# Altium footprint library rus.PcbLib: 83 footprints (part 2 of 6)
Each footprint in its own frame and in the unit in brackets; x right, y up, seen from the top. Pads: shape width x height; smd on the part's side, far side on the other; paste and mask are expansions set on the pad; w line width, h text height; cw(c..) or ccw(c..) is an arc to the next point about the centre after c.
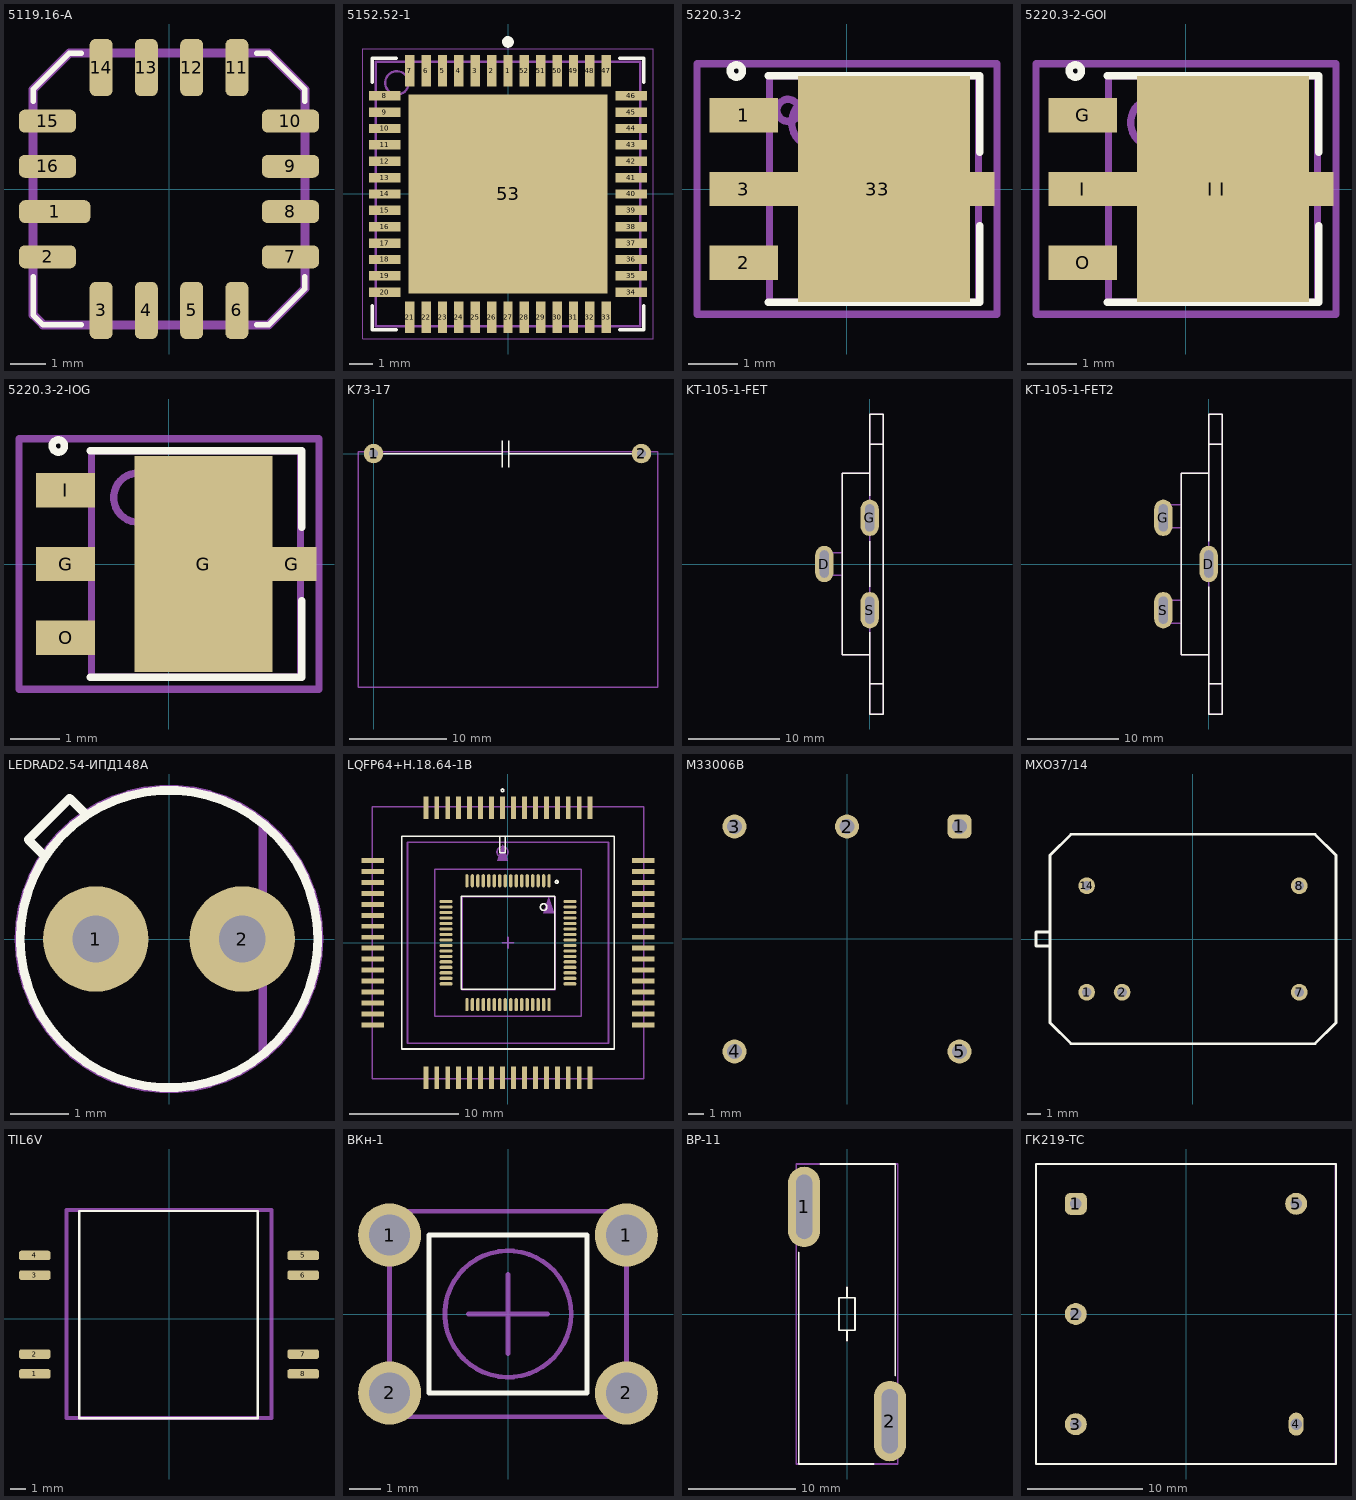
[diagram p1: the footprints below, top view; thin cyan lines are the x and y axes]

## 5119.16-А [mm] "5119.16-А"
height 0.7
pads (16):
  rrect50% 2x0.64 smd: 1(-3.205,-0.635)
  rrect50% 1.6x0.64 smd: 2(-3.408,-1.905) 7(3.408,-1.905) 8(3.408,-0.635) 9(3.408,0.635) 10(3.408,1.905) 15(-3.408,1.905) 16(-3.408,0.635)
  rrect50% 0.64x1.6 smd: 3(-1.905,-3.408) 4(-0.635,-3.408) 5(0.635,-3.408) 6(1.905,-3.408) 11(1.905,3.408) 12(0.635,3.408) 13(-0.635,3.408) 14(-1.905,3.408)
Top Overlay:
  lines w0.15: -3.81,-2.464 -3.81,-3.531 -3.531,-3.81 -2.464,-3.81 ; -3.81,2.464 -3.81,2.794 -2.794,3.81 -2.464,3.81 ; 2.464,-3.81 2.794,-3.81 3.81,-2.794 3.81,-2.464 ; 2.464,3.81 2.794,3.81 3.81,2.794 3.81,2.464
  text "." at -4.8,-0.7 h0.1
Top Courtyard:
  lines w0.25: -3.81,-3.531 -3.81,2.794 -2.794,3.81 2.794,3.81 3.81,2.794 3.81,-2.794 2.794,-3.81 -3.531,-3.81 -3.81,-3.531
3D body: height 1.5, standoff 0.15, extent -3.806,-3.806 3.806,3.806
3D body: height 2.4, standoff 0.2, extent -3.429,-3.429 3.429,3.429
3D body: height 1, standoff 0.1, extent -3.831,0.254 -2.667,1.016
3D body: height 1, standoff 0.1, extent -3.831,-1.016 -2.032,-0.254
3D body: height 1, standoff 0.1, extent -3.831,-2.286 -2.667,-1.524
3D body: height 1, standoff 0.1, extent -3.831,1.524 -2.667,2.286
3D body: height 1, standoff 0.1, extent -1.016,-3.831 -0.254,-2.667
3D body: height 1, standoff 0.1, extent 0.254,-3.831 1.016,-2.667
3D body: height 1, standoff 0.1, extent 1.524,-3.831 2.286,-2.667
3D body: height 1, standoff 0.1, extent -2.286,-3.831 -1.524,-2.667
3D body: height 1, standoff 0.1, extent 2.667,-1.016 3.831,-0.254
3D body: height 1, standoff 0.1, extent 2.667,0.254 3.831,1.016
3D body: height 1, standoff 0.1, extent 2.667,1.524 3.831,2.286
3D body: height 1, standoff 0.1, extent 2.667,-2.286 3.831,-1.524
3D body: height 1, standoff 0.1, extent 0.254,2.667 1.016,3.831
3D body: height 1, standoff 0.1, extent -1.016,2.667 -0.254,3.831
3D body: height 1, standoff 0.1, extent -2.286,2.667 -1.524,3.831
3D body: height 1, standoff 0.1, extent 1.524,2.667 2.286,3.831

## 5152.52-1 [mm] "QFN, 52-Leads, Body 11,20x11,20mm, Pitch 0,70mm, Thermal Pad 8,50x8,50mm, IPC Medium Density"
height 2.06
pads (53):
  rect 0.4x1.35 smd: 1(0,5.275) 2(-0.7,5.275) 3(-1.4,5.275) 4(-2.1,5.275) 5(-2.8,5.275) 6(-3.5,5.275) 7(-4.2,5.275) 21(-4.2,-5.275) 22(-3.5,-5.275) 23(-2.8,-5.275) 24(-2.1,-5.275) 25(-1.4,-5.275) 26(-0.7,-5.275) 27(0,-5.275) 28(0.7,-5.275) 29(1.4,-5.275) 30(2.1,-5.275) 31(2.8,-5.275) 32(3.5,-5.275) 33(4.2,-5.275) 47(4.2,5.275) 48(3.5,5.275) 49(2.8,5.275) 50(2.1,5.275) 51(1.4,5.275) 52(0.7,5.275)
  rect 1.35x0.4 smd: 8(-5.275,4.2) 9(-5.275,3.5) 10(-5.275,2.8) 11(-5.275,2.1) 12(-5.275,1.4) 13(-5.275,0.7) 14(-5.275,0) 15(-5.275,-0.7) 16(-5.275,-1.4) 17(-5.275,-2.1) 18(-5.275,-2.8) 19(-5.275,-3.5) 20(-5.275,-4.2) 34(5.275,-4.2) 35(5.275,-3.5) 36(5.275,-2.8) 37(5.275,-2.1) 38(5.275,-1.4) 39(5.275,-0.7) 40(5.275,0) 41(5.275,0.7) 42(5.275,1.4) 43(5.275,2.1) 44(5.275,2.8) 45(5.275,3.5) 46(5.275,4.2)
  rect 8.5x8.5 smd: 53(0,0)
Top Overlay:
  circle w0.25: c0,6.5 r0.125
  lines w0.15: -5.8,-4.775 -5.8,-5.8 -4.775,-5.8 ; -5.8,4.775 -5.8,5.8 -4.775,5.8 ; 4.775,-5.8 5.8,-5.8 5.8,-4.775 ; 4.775,5.8 5.8,5.8 5.8,4.775
Mechanical 13:
  circle w0.1: c-4.75,4.75 r0.5
  lines w0.1: -5.65,-5.65 5.65,-5.65 5.65,5.65 -5.65,5.65 -5.65,-5.65
Mechanical 15:
  lines w0.05: -6.2,-6.2 6.2,-6.2 6.2,6.2 -6.2,6.2 -6.2,-6.2
  lines w0.1: -0.5,0 0.5,0 ; 0,-0.5 0,0.5
3D body "5152.52-1.step": height 2.06, standoff 0, extent -5.651,-5.651 5.651,5.651

## 5220.3-2 [mm] "SOT89, 3-Leads, Body 4,60x4,25mm, Pitch 1,50mm, Lead Span 4,8mm, IPC Medium Density"
height 1.6
pads (5):
  rect 1.4x0.7 smd: 1(-2.1,1.5) 2(-2.1,-1.5) 3(-2.1,0)
  rect 5x0.7 smd: 3(0.5,0)
  rect 3.5x4.6 smd: 3(0.75,0)
Top Overlay:
  circle w0.15: c-2.25,2.4 r0.125
  lines w0.15: -1.6,-2.3 2.7,-2.3 2.7,-0.75 ; -1.6,2.3 2.7,2.3 2.7,0.75
Mechanical 13:
  circle w0.15: c-0.625,1.35 r0.5
Mechanical 15:
  lines w0.15: 0.05,0 1.05,0 ; 0.55,-0.5 0.55,0.5 ; -3.05,-2.55 -3.05,2.55 3.05,2.55 3.05,-2.55 -3.05,-2.55
Mechanical 29:
  circle w0.15: c-1.2,1.6 r0.224
  lines w0.15: -1.575,-2.3 -1.575,2.3 2.675,2.3 2.675,-2.3 -1.575,-2.3
  text ".Designator" at -1.3,-0.4 h1
3D body "5220.3-2-IOG.step": height 1.6, standoff 0, extent -2.75,-2.3 2.85,2.3

## 5220.3-2-GOI [mm] "SOT89, 3-Leads, Body 4,60x4,25mm, Pitch 1,50mm, Lead Span 4,8mm, IPC Medium Density"
height 1.6
pads (5):
  rect 1.4x0.7 smd: G(-2.1,1.5) I(-2.1,0) O(-2.1,-1.5)
  rect 5x0.7 smd: I(0.5,0)
  rect 3.5x4.6 smd: I(0.75,0)
Top Overlay:
  circle w0.15: c-2.25,2.4 r0.125
  lines w0.15: -1.6,-2.3 2.7,-2.3 2.7,-0.75 ; -1.6,2.3 2.7,2.3 2.7,0.75
Mechanical 15:
  lines w0.15: 0.05,0 1.05,0 ; 0.55,-0.5 0.55,0.5 ; -3.05,-2.55 3.05,-2.55 3.05,2.55 -3.05,2.55 -3.05,-2.55
Mechanical 29:
  circle w0.15: c-0.625,1.35 r0.5
  lines w0.15: -1.575,-2.3 2.675,-2.3 2.675,2.3 -1.575,2.3 -1.575,-2.3
  text ".Designator" at -1.4,-0.5 h1
3D body "5220.3-2-IOG.step": height 1.6, standoff 0, extent -2.75,-2.3 2.85,2.3

## 5220.3-2-IOG [mm] "SOT89, 3-Leads, Body 4,60x4,25mm, Pitch 1,50mm, Lead Span 4,8mm, IPC Medium Density"
height 1.6
pads (5):
  rect 1.2x0.7 smd: G(-2.1,0) I(-2.1,1.5) O(-2.1,-1.5)
  rect 2.8x4.4 smd: G(0.7,0)
  rect 1x0.7 smd: G(2.5,0)
Top Overlay:
  circle w0.15: c-2.25,2.4 r0.125
  lines w0.15: -1.6,-2.3 2.7,-2.3 2.7,-0.75 ; -1.6,2.3 2.7,2.3 2.7,0.75
Mechanical 15:
  lines w0.15: 0.05,0 1.05,0 ; 0.55,-0.5 0.55,0.5 ; -3.05,-2.55 3.05,-2.55 3.05,2.55 -3.05,2.55 -3.05,-2.55
Mechanical 29:
  circle w0.15: c-0.625,1.35 r0.5
  lines w0.15: -1.575,-2.3 2.675,-2.3 2.675,2.3 -1.575,2.3 -1.575,-2.3
  text ".Designator" at -1.4,-0.4 h1
3D body "5220.3-2-IOG.step": height 1.6, standoff 0, extent -2.75,-2.3 2.85,2.3

## K73-17 [mm]
pads (2):
  round 2 hole 0.9: 1(0,0) 2(27.5,0)
Top Overlay:
  lines w0.15: 0,0 13.225,0 13.225,-0.037 ; 13.225,-1.4 13.225,1.325 ; 13.875,-1.4 13.875,1.325 ; 13.875,-0.037 13.875,0 27.5,0
Mechanical 29:
  lines w0.15: -1.6,-24 29.2,-24 29.2,0.2 -1.6,0.2 -1.6,-24
  text ".Designator" at 9.1,-12 h1
3D body "K73-17.STEP": height 14.51, standoff -2, extent -1.725,-24.05 29.275,0.35

## KT-105-1-FET [mm]
height 30
pads (3):
  oval 2x4 hole 1 slot 3 at 90 deg: D(-5,0) G(0,5.08) S(0,-5.08)
Top Overlay:
  lines w0.15: 0,-13.2 1.5,-13.2 ; 0,-10 -3,-10 -3,10 0,10 ; 0,-7.5 0,-16.5 1.5,-16.5 1.5,-7.5 1.5,7.5 1.5,11 1.5,16.5 1.35,16.5 0,16.5 0,7.5 ; 0,-2.5 0,2.5 ; 0,13.2 1.5,13.2
Mechanical 29:
  lines w0.15: -3,-1.25 -5,-1.25 -5,1.25 -3,1.25 ; 0,-13.2 1.5,-13.2 ; 0,-10 -3,-10 -3,10 0,10 ; 0,13.2 1.5,13.2 ; 0,-16.5 0,-7.5 0,16.5 1.35,16.5 1.5,16.5 1.5,11 1.5,7.5 1.5,-7.5 1.5,-16.5 0,-16.5
  text ".Designator" at -1.3,-4.2 h1
3D body "KT-105-1-flex.STEP": height 30.8, standoff -3.2, extent -5.3,-16.35 1.2,16.35

## KT-105-1-FET2 [mm]
height 30
pads (3):
  oval 2x4 hole 1 slot 3 at 90 deg: D(0,0) G(-5,5.08) S(-5,-5.08)
Top Overlay:
  lines w0.15: 0,-13.2 1.5,-13.2 ; 0,-10 -3,-10 -3,10 0,10 ; 0,-2.5 0,-16.5 1.5,-16.5 1.5,-7.5 1.5,7.5 1.5,11 1.5,16.5 1.35,16.5 0,16.5 0,2.5 ; 0,13.2 1.5,13.2
Mechanical 29:
  lines w0.15: -3,-6.5 -5,-6.5 -5,-4 -3,-4 ; -3,4 -5,4 -5,6.5 -3,6.5 ; 0,-13.2 1.5,-13.2 ; 0,-10 -3,-10 -3,10 0,10 ; 0,13.2 1.5,13.2 ; 0,-16.5 0,-7.5 0,16.5 1.35,16.5 1.5,16.5 1.5,11 1.5,7.5 1.5,-7.5 1.5,-16.5 0,-16.5
  text ".Designator" at -1.2,-3.6 h1
3D body "KT-105-1-flex2.STEP": height 30.8, standoff -3.2, extent -5.3,-16.35 1.2,16.35

## LEDRAD2.54-ИПД148А [mm]
height 10
pads (2):
  round 1.8 hole 0.8: 1(-1.252,0) 2(1.252,0)
Top Overlay:
  circle w0.15: c0,0 r2.54
  lines w0.15: -2.121,1.414 -2.404,1.697 -1.697,2.404 -1.414,2.121
Mechanical 29:
  circle w0.15: c0,0 r2.561
  lines w0.15: 1.6,-2 1.6,2
  text ".Designator" at -2.2,-0.4 h1
3D body "ИПД148Аподставка.STEP": height 4.5, standoff 0, extent -3,-3 3,3
3D body "ИПД148А.STEP": height 9.19, standoff -2.5, extent -2.92,-2.92 2.92,2.933

## LQFP64+Н.18.64-1В [mm] "CQFP, 64-Leads, Body 23,40x23,40mm, Pitch 1,00mm, IPC Medium Density"
height 3.5
pads (128):
  oval 0.3x1.2 smd: 1(3.75,5.65) 2(3.25,5.65) 3(2.75,5.65) 4(2.25,5.65) 5(1.75,5.65) 6(1.25,5.65) 7(0.75,5.65) 8(0.25,5.65) 9(-0.25,5.65) 10(-0.75,5.65) 11(-1.25,5.65) 12(-1.75,5.65) 13(-2.25,5.65) 14(-2.75,5.65) 15(-3.25,5.65) 16(-3.75,5.65) 33(-3.75,-5.65) 34(-3.25,-5.65) 35(-2.75,-5.65) 36(-2.25,-5.65) 37(-1.75,-5.65) 38(-1.25,-5.65) 39(-0.75,-5.65) 40(-0.25,-5.65) 41(0.25,-5.65) 42(0.75,-5.65) 43(1.25,-5.65) 44(1.75,-5.65) 45(2.25,-5.65) 46(2.75,-5.65) 47(3.25,-5.65) 48(3.75,-5.65)
  rect 0.45x2.05 smd: 1(7.5,12.325) 2(6.5,12.325) 3(5.5,12.325) 4(4.5,12.325) 5(3.5,12.325) 6(2.5,12.325) 7(1.5,12.325) 8(0.5,12.325) 9(-0.5,12.325) 10(-1.5,12.325) 11(-2.5,12.325) 12(-3.5,12.325) 13(-4.5,12.325) 14(-5.5,12.325) 15(-6.5,12.325) 16(-7.5,12.325) 33(-7.5,-12.325) 34(-6.5,-12.325) 35(-5.5,-12.325) 36(-4.5,-12.325) 37(-3.5,-12.325) 38(-2.5,-12.325) 39(-1.5,-12.325) 40(-0.5,-12.325) 41(0.5,-12.325) 42(1.5,-12.325) 43(2.5,-12.325) 44(3.5,-12.325) 45(4.5,-12.325) 46(5.5,-12.325) 47(6.5,-12.325) 48(7.5,-12.325)
  rect 2.05x0.45 smd: 17(-12.325,7.5) 18(-12.325,6.5) 19(-12.325,5.5) 20(-12.325,4.5) 21(-12.325,3.5) 22(-12.325,2.5) 23(-12.325,1.5) 24(-12.325,0.5) 25(-12.325,-0.5) 26(-12.325,-1.5) 27(-12.325,-2.5) 28(-12.325,-3.5) 29(-12.325,-4.5) 30(-12.325,-5.5) 31(-12.325,-6.5) 32(-12.325,-7.5) 49(12.325,-7.5) 50(12.325,-6.5) 51(12.325,-5.5) 52(12.325,-4.5) 53(12.325,-3.5) 54(12.325,-2.5) 55(12.325,-1.5) 56(12.325,-0.5) 57(12.325,0.5) 58(12.325,1.5) 59(12.325,2.5) 60(12.325,3.5) 61(12.325,4.5) 62(12.325,5.5) 63(12.325,6.5) 64(12.325,7.5)
  oval 1.2x0.3 smd: 17(-5.65,3.75) 18(-5.65,3.25) 19(-5.65,2.75) 20(-5.65,2.25) 21(-5.65,1.75) 22(-5.65,1.25) 23(-5.65,0.75) 24(-5.65,0.25) 25(-5.65,-0.25) 26(-5.65,-0.75) 27(-5.65,-1.25) 28(-5.65,-1.75) 29(-5.65,-2.25) 30(-5.65,-2.75) 31(-5.65,-3.25) 32(-5.65,-3.75) 49(5.65,-3.75) 50(5.65,-3.25) 51(5.65,-2.75) 52(5.65,-2.25) 53(5.65,-1.75) 54(5.65,-1.25) 55(5.65,-0.75) 56(5.65,-0.25) 57(5.65,0.25) 58(5.65,0.75) 59(5.65,1.25) 60(5.65,1.75) 61(5.65,2.25) 62(5.65,2.75) 63(5.65,3.25) 64(5.65,3.75)
Top Overlay:
  circle w0.15: c4.45,5.55 r0.125
  circle w0.15: c3.25,3.25 r0.3
  circle w0.15: c-0.5,13.9 r0.125
  lines w0.15: -0.75,9.7 -0.75,8.2 -0.25,8.2 -0.25,9.7 ; -9.7,-9.7 -9.7,9.7 9.7,9.7 9.7,-9.7 -9.7,-9.7 ; -4.25,-4.25 4.25,-4.25 4.25,4.25 -4.25,4.25 -4.25,-4.25
Mechanical 13:
  circle w0.15: c-0.5,8.275 r0.5
Mechanical 15:
  lines w0.15: -12.4,-12.4 -12.4,12.4 12.4,12.4 12.4,-12.4 -12.4,-12.4 ; -6.7,-6.7 6.7,-6.7 6.7,6.7 -6.7,6.7 -6.7,-6.7 ; -0.5,0 0.5,0 -0.5,0 ; 0,-0.5 0,0.5 0,-0.5
Mechanical 29:
  region: -0.5,9 0,7.5 -1,7.5
  region: 3.7,4.2 4.2,2.7 3.2,2.7
  lines w0.15: -9.175,-9.175 -9.175,9.175 9.175,9.175 9.175,-9.175 -9.175,-9.175 ; -4.2,-4.3 4.3,-4.3 4.3,4.2 -4.2,4.2 -4.2,-4.3
  text ".Designator" at -3.1,-0.6 h1
3D body "Н.18.64-1В.STEP": height 4.11, standoff 0, extent -13.15,-13.15 13.15,13.15
3D body: height 1.5, standoff 0, extent -6,-6 6,6

## M33006B [mm] "Генератор кварцевый"
height 12.5
pads (5):
  rrect50% 1.6x1.6 hole 1: 1(7.5,7.5)
  round 1.6 hole 1: 2(0,7.5) 3(-7.5,7.5) 4(-7.5,-7.5) 5(7.5,-7.5)
Bottom Overlay:
  lines w0.15: 10,-6.2 10,10 -10,10 -10,-10 10,-10 10,-6
3D body "М33006В.STEP": height 12.5, standoff -6, extent -10.25,-10.25 10.25,10.25

## MXO37/14 [mm]
pads (5):
  round 1.2 hole 0.7: 1(-7.62,-3.81) 2(-5.08,-3.81) 7(7.62,-3.81) 8(7.62,3.81) 14(-7.62,3.81)
Top Overlay:
  lines w0.2: -10.25,-0.5 -11.25,-0.5 -11.25,0.5 -10.25,0.5 ; -10.25,-6 -10.25,0 -10.25,6 -8.75,7.5 0,7.5 8.75,7.5 10.25,6 10.25,0 10.25,-6 8.75,-7.5 0,-7.5 -8.75,-7.5 -10.25,-6
3D body: height 9, standoff 3, extent -9.652,-6.35 3.048,6.35
3D body: height 3.5, standoff 3, extent -10.802,-7.5 4.198,7.5
3D body: height 1, standoff 0.5, extent -10.16,-7.62 10.16,7.62

## TIL6V [mm] "MILSTD1553 DATABUS INTERFACE TRANSFORMERS"
pads (8):
  rrect50% 2x0.6 smd: 1(-8.5,-3.49) 2(-8.5,-2.24) 3(-8.5,2.76) 4(-8.5,4.01) 5(8.5,4.01) 6(8.5,2.76) 7(8.5,-2.24) 8(8.5,-3.49)
Top Overlay:
  lines w0.15: -5.675,-6.3 -5.675,6.82 5.625,6.82 5.625,-6.3 -5.675,-6.3
  text "." at -8.51,-4.475 h0.1
Top Courtyard:
  lines w0.25: -6.5,-6.3 6.5,-6.3 6.5,6.9 -6.5,6.9 -6.5,-6.3
3D body "User Library-TIL6V.step": height 7.95, standoff 0, extent -8.95,-5.904 9.05,6.454

## ВКн-1 [mm]
height 7
pads (4):
  round 2 hole 1.3: 1(-3.75,2.5) 1(3.75,2.5) 2(-3.75,-2.5) 2(3.75,-2.5)
Top Overlay:
  lines w0.15: -2.5,-2.5 2.5,-2.5 2.5,2.5 -2.5,2.5 -2.5,-2.5
Mechanical 15:
  lines w0.15: -1.25,0 1.25,0 ; 0,-1.25 0,1.25
Mechanical 29:
  circle w0.15: c0,0 r2
  lines w0.15: -3.75,-3.25 3.75,-3.25 3.75,3.25 -3.75,3.25 -3.75,-3.25
  text ".Designator" at -2.9,3.5 h1
3D body "ВКн-1.STEP": height 5.7, standoff -2.5, extent -3.75,-3.25 3.75,3.25

## ВР-11 [mm]
height 28
pads (2):
  oval 3x7.5 hole 1.5 slot 6 at 90 deg unplated: 1(-4,10) 2(4,-10)
Top Overlay:
  lines w0.15: -4.5,5.75 -4.5,-14 2.5,-14 ; -2.5,14 4.5,14 4.5,-5.75 ; 0,-2.5 0,-1.5 ; 0,1.5 0,2.5 ; -0.75,-1.5 -0.75,1.5 0.75,1.5 0.75,-1.5 -0.75,-1.5
Mechanical 29:
  lines w0.15: -4.75,-14 4.75,-14 4.75,14 -4.75,14 -4.75,-14
  text ".Designator" at -3.2,-0.3 h1
3D body "ВР-11.STEP": height 28.5, standoff -4.5, extent -4.65,-14 4.65,14

## ГК219-ТС [mm] "Прецизионный малошумящий кварцевый генератор"
height 11.1
pads (5):
  rrect50% 1.9x1.9 hole 1: 1(-9.55,9.55)
  round 1.9 hole 1: 2(-9.55,0) 3(-9.55,-9.55) 5(9.55,9.55)
  oval 1.3x2 hole 1: 4(9.55,-9.55)
Top Overlay:
  lines w0.15: -13,-13 13,-13 13,13 -13,13 -13,-13
Mechanical 5:
  lines w0.2: 12.975,-13 12.975,13
3D body: height 10.3, standoff 0, extent -13,-13 13,13